# Altium footprint library PCB_IntegratedCircuit.PcbLib: 75 footprints (part 5 of 5)
Each footprint in its own frame and in the unit in brackets; x right, y up, seen from the top. Pads: shape width x height; smd on the part's side, far side on the other; paste and mask are expansions set on the pad; w line width, h text height; cw(c..) or ccw(c..) is an arc to the next point about the centre after c.
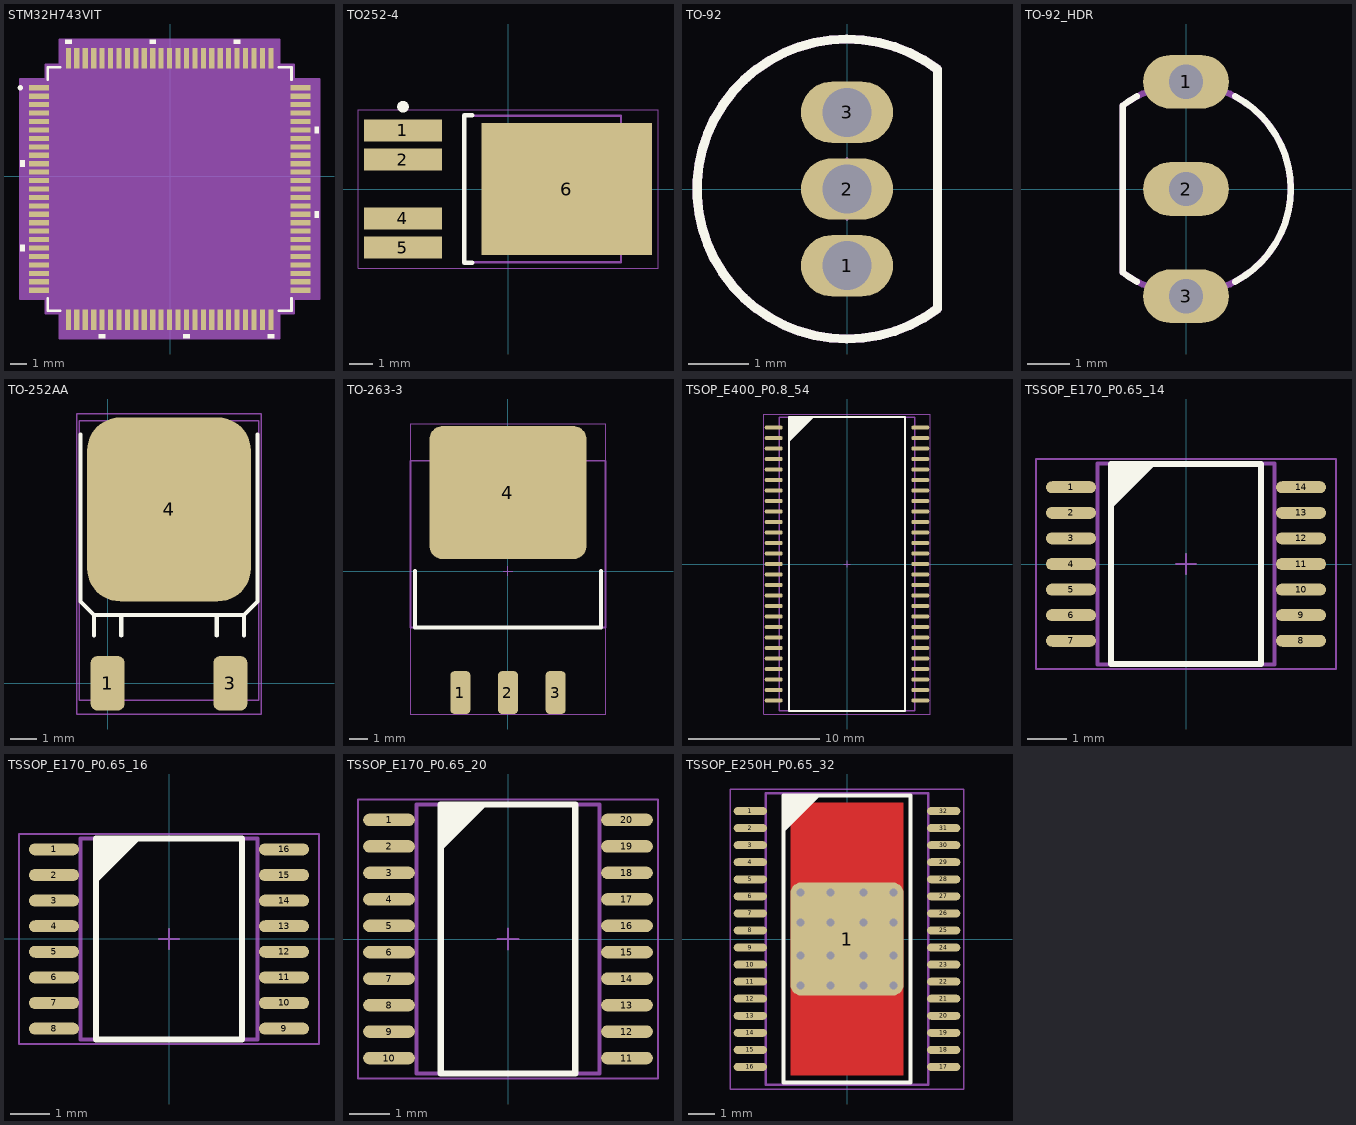
[diagram p4: the footprints below, top view; thin cyan lines are the x and y axes]

## STM32H743VIT [mil]
pads (100):
  rect 47x12 smd: 1(-306.12,206.22) 2(-306.12,186.54) 3(-306.12,166.85) 4(-306.12,147.17) 5(-306.12,127.48) 6(-306.12,107.8) 7(-306.12,88.11) 8(-306.12,68.43) 9(-306.12,48.74) 10(-306.12,29.06) 11(-306.12,9.37) 12(-306.12,-10.31) 13(-306.12,-30) 14(-306.12,-49.69) 15(-306.12,-69.37) 16(-306.12,-89.06) 17(-306.12,-108.74) 18(-306.12,-128.43) 19(-306.12,-148.11) 20(-306.12,-167.8) 21(-306.12,-187.48) 22(-306.12,-207.17) 23(-306.12,-226.85) 24(-306.12,-246.54) 25(-306.12,-266.22) 51(304.12,-266.22) 52(304.12,-246.54) 53(304.12,-226.85) 54(304.12,-207.17) 55(304.12,-187.48) 56(304.12,-167.8) 57(304.12,-148.11) 58(304.12,-128.43) 59(304.12,-108.74) 60(304.12,-89.06) 61(304.12,-69.37) 62(304.12,-49.69) 63(304.12,-30) 64(304.12,-10.31) 65(304.12,9.37) 66(304.12,29.06) 67(304.12,48.74) 68(304.12,68.43) 69(304.12,88.11) 70(304.12,107.8) 71(304.12,127.48) 72(304.12,147.17) 73(304.12,166.85) 74(304.12,186.54) 75(304.12,206.22)
  rect 12x47 smd: 26(-237.22,-335.12) 27(-217.54,-335.12) 28(-197.85,-335.12) 29(-178.17,-335.12) 30(-158.48,-335.12) 31(-138.8,-335.12) 32(-119.11,-335.12) 33(-99.43,-335.12) 34(-79.74,-335.12) 35(-60.06,-335.12) 36(-40.37,-335.12) 37(-20.68,-335.12) 38(-1,-335.12) 39(18.68,-335.12) 40(38.37,-335.12) 41(58.06,-335.12) 42(77.74,-335.12) 43(97.43,-335.12) 44(117.11,-335.12) 45(136.8,-335.12) 46(156.48,-335.12) 47(176.17,-335.12) 48(195.85,-335.12) 49(215.54,-335.12) 50(235.22,-335.12) 76(235.22,275.12) 77(215.54,275.12) 78(195.85,275.12) 79(176.17,275.12) 80(156.48,275.12) 81(136.8,275.12) 82(117.11,275.12) 83(97.43,275.12) 84(77.74,275.12) 85(58.06,275.12) 86(38.37,275.12) 87(18.68,275.12) 88(-1,275.12) 89(-20.68,275.12) 90(-40.37,275.12) 91(-60.06,275.12) 92(-79.74,275.12) 93(-99.43,275.12) 94(-119.11,275.12) 95(-138.8,275.12) 96(-158.48,275.12) 97(-178.17,275.12) 98(-197.85,275.12) 99(-217.54,275.12) 100(-237.22,275.12)
Top Overlay:
  circle w6: c-349.46,206.22 r3
  region: -229.72,308.62 -244.72,308.62 -244.72,318.62 -229.72,318.62
  region: -32.87,308.62 -47.87,308.62 -47.87,318.62 -32.87,318.62
  region: 163.98,308.62 148.98,308.62 148.98,318.62 163.98,318.62
  region: 337.62,115.3 347.62,115.3 347.62,100.3 337.62,100.3
  region: 337.62,-81.56 347.62,-81.56 347.62,-96.56 337.62,-96.56
  region: 242.72,-368.62 227.72,-368.62 227.72,-378.62 242.72,-378.62
  region: 45.87,-368.62 30.87,-368.62 30.87,-378.62 45.87,-378.62
  region: -150.98,-368.62 -165.98,-368.62 -165.98,-378.62 -150.98,-378.62
  region: -339.62,-160.3 -349.62,-160.3 -349.62,-175.3 -339.62,-175.3
  region: -339.62,36.56 -349.62,36.56 -349.62,21.56 -339.62,21.56
  lines w6: -285.5,-285.32 -285.5,-314.5 -256.32,-314.5 ; -285.5,225.32 -285.5,254.5 -256.32,254.5 ; 254.32,-314.5 283.5,-314.5 283.5,-285.32 ; 254.32,254.5 283.5,254.5 283.5,225.32
Mechanical 13:
  circle w0: c-257.62,206.22 r3
B-Component:
  region: -257.22,-319.5 -290.5,-319.5 -290.5,-286.22 -349.62,-286.22 -349.62,226.22 -290.5,226.22 -290.5,259.5 -257.22,259.5 -257.22,318.62 255.22,318.62 255.22,259.5 288.5,259.5 288.5,226.22 347.62,226.22 347.62,-286.22 288.5,-286.22 288.5,-319.5 255.22,-319.5 255.22,-378.62 -257.22,-378.62
  lines w6: -349.62,-286.22 -349.62,226.22 -290.5,226.22 -290.5,259.5 -257.22,259.5 -257.22,318.62 255.22,318.62 255.22,259.5 288.5,259.5 288.5,226.22 347.62,226.22 347.62,-286.22 288.5,-286.22 288.5,-319.5 255.22,-319.5 255.22,-378.62 -257.22,-378.62 -257.22,-319.5 -290.5,-319.5 -290.5,-286.22 -349.62,-286.22
Multi-Layer:
  text "Copyright (C) 2016 Accelerated Designs. All rights reserved" at -1,-30 h1
3D body "LQFP100-14x14mm.stp": height 63.1, standoff 0, extent -315.84,-344.84 313.84,284.84

## TO252-4 [mm]
height 2.38
pads (5):
  rect 3.4x0.95 smd: 1(-4.55,2.54) 2(-4.55,1.27) 4(-4.55,-1.27) 5(-4.55,-2.54)
  rect 7.4x5.7 smd: 6(2.55,0)
Top Overlay:
  circle w0.25: c-4.55,3.565 r0.125
  lines w0.2: -1.55,-3.2 -1.9,-3.2 -1.9,3.2 -1.55,3.2
Mechanical 13:
  lines w0.1: -1.9,-3.175 4.9,-3.175 4.9,3.175 -1.9,3.175 -1.9,-3.175
B-Component:
  lines w0.05: -6.5,-3.425 6.5,-3.425 6.5,3.425 -6.5,3.425 -6.5,-3.425
  lines w0.1: -0.5,0 0.5,0 ; 0,-0.5 0,0.5
3D body: height 2.38, standoff 0, extent -1.9,-3.175 4.9,3.175

## TO-92 [mil]
pads (3):
  oval 60x40 hole 32: 1(0,-50) 2(0,0) 3(0,50)
Top Overlay:
  lines w6: 59.06,-77.95 cw(c0,0) 59.06,77.95 59.05,-77.95
Mechanical 13:
  lines w2: -10,0 10,0 ; 0,-10 0,10
  lines w6: 59.06,-77.95 cw(c0,0) 59.06,77.95 59.05,-77.95
B-Component:
  lines w2: -20,0 20,0 ; 0,-20 0,20
3D body "SW3dPS-TO-92.STEP": height 405.76, standoff -228.35, extent -120,-124.1 69.37,120

## TO-92_HDR [mil]
pads (3):
  oval 80x50 hole 32: 1(0,100) 2(0,0) 3(0,-100)
Top Overlay:
  lines w6: -45.76,-86.43 cw(c0,0) -59.06,-77.95 -59.05,77.95 cw(c0,0) -45.76,86.43 ; 45.76,-86.43 ccw(c0,0) 45.76,86.43
Mechanical 13:
  lines w2: -10,0 10,0 ; 0,-10 0,10
  lines w6: -59.06,-77.95 ccw(c0,0) -59.06,77.95 -59.05,-77.95
B-Component:
  lines w2: -20,0 20,0 ; 0,-20 0,20
3D body "User Library-TO-92-4.STEP": height 409.84, standoff -300, extent -60.24,-112.28 104.72,113.7

## TO-252AA [mil]
pads (3):
  rrect40% 50x80 smd: 1(0,0) 3(180,0)
  rrect40% 240x270 smd: 4(90,255)
Top Overlay:
  lines w6: -40,365 -40,120 -20,100 ; -20,70 -20,100 ; 20,70 20,100 ; 160,70 160,100 ; 200,70 200,100 ; 220,365 220,120 200,100 ; -20,100 200,100
Mechanical 13:
  lines w2: -42,-25 222,-25 222,385 -42,385 -42,-25
T-Component:
  lines w2: -45,-45 -45,395 225,395 225,-45 -45,-45
3D body "TO-252.STEP": height 90.56, standoff -4.52, extent -38.73,-16.77 218.75,374.5

## TO-263-3 [mil]
height 182.68
pads (4):
  rrect40% 42x90 smd: 1(-100,-255) 2(0,-255) 3(100,-255)
  rrect20% 330x280 smd: 4(0,165)
Top Overlay:
  lines w8: -195,0 -195,-118.11 195,-118.11 195,0
Mechanical 13:
  lines w2: -10,0 10,0 ; 0,-10 0,10
  lines w4: -204.72,-118.11 204.72,-118.11 204.72,231.89 -204.72,231.89 -204.72,-118.11
T-Component:
  lines w2: -205,-300 205,-300 205,310 -205,310 -205,-300
3D body "SW3dPS-to-263.STEP": height 184.65, standoff 0, extent -199.99,-292.88 200.01,315

## TSOP_E400_P0.8_54 [mil]
height 47.24
pads (54):
  oval 54x12 smd: 1(-220,409.45) 2(-220,377.95) 3(-220,346.46) 4(-220,314.96) 5(-220,283.46) 6(-220,251.97) 7(-220,220.47) 8(-220,188.98) 9(-220,157.48) 10(-220,125.98) 11(-220,94.49) 12(-220,62.99) 13(-220,31.5) 14(-220,0) 15(-220,-31.5) 16(-220,-62.99) 17(-220,-94.49) 18(-220,-125.98) 19(-220,-157.48) 20(-220,-188.98) 21(-220,-220.47) 22(-220,-251.97) 23(-220,-283.47) 24(-220,-314.96) 25(-220,-346.46) 26(-220,-377.95) 27(-220,-409.45) 28(220,-409.45) 29(220,-377.95) 30(220,-346.46) 31(220,-314.96) 32(220,-283.47) 33(220,-251.97) 34(220,-220.47) 35(220,-188.98) 36(220,-157.48) 37(220,-125.98) 38(220,-94.49) 39(220,-62.99) 40(220,-31.5) 41(220,0) 42(220,31.5) 43(220,62.99) 44(220,94.49) 45(220,125.98) 46(220,157.48) 47(220,188.98) 48(220,220.47) 49(220,251.97) 50(220,283.46) 51(220,314.96) 52(220,346.46) 53(220,377.95) 54(220,409.45)
Top Overlay:
  region: -174.21,440.94 -99.06,440.94 -174.21,365.79
  lines w6: -174.21,-440.94 -174.21,440.94 174.21,440.94 174.21,-440.94 -174.21,-440.94
Mechanical 13:
  lines w2: -10,0 10,0 ; 0,-10 0,10
  lines w4: -202.76,-440.94 -202.76,440.94 202.76,440.94 202.76,-440.94 -202.76,-440.94
T-Component:
  lines w2: -250,-450 250,-450 250,450 -250,450 -250,-450
3D body "SW3dPS-TSOP2-54.STEP": height 51, standoff -15.9, extent -231.5,-437.8 231.5,437

## TSSOP_E170_P0.65_14 [mil]
height 47.24
pads (14):
  oval 50x12 smd: 1(-115,76.77) 2(-115,51.18) 3(-115,25.59) 4(-115,0) 5(-115,-25.59) 6(-115,-51.18) 7(-115,-76.77) 8(115,-76.77) 9(115,-51.18) 10(115,-25.59) 11(115,0) 12(115,25.59) 13(115,51.18) 14(115,76.77)
Top Overlay:
  region: -75,100.47 -30,100.47 -75,55.47
  lines w6: -75,-100 75,-100 75,100 -75,100 -75,-100
Mechanical 13:
  lines w2: -10,0 10,0 ; 0,-10 0,10
  lines w3.94: -88.58,-100.39 88.58,-100.39 88.58,100.39 -88.58,100.39 -88.58,-100.39
T-Component:
  lines w2: -150,-105 -150,105 150,105 150,-105 -150,-105
3D body "User Library-tssop14-2.STEP": height 47.24, standoff 0, extent -125.98,-100.39 125.99,100.4

## TSSOP_E170_P0.65_16 [mil]
height 47.24
pads (16):
  oval 50x12 smd: 1(-115,89.57) 2(-115,63.98) 3(-115,38.39) 4(-115,12.8) 5(-115,-12.8) 6(-115,-38.39) 7(-115,-63.98) 8(-115,-89.57) 9(115,-89.57) 10(115,-63.98) 11(115,-38.39) 12(115,-12.8) 13(115,12.8) 14(115,38.39) 15(115,63.98) 16(115,89.57)
Top Overlay:
  region: -72.83,100.87 -27.83,100.87 -72.83,55.87
  lines w6: -72.83,-100.39 72.83,-100.39 72.83,100.39 -72.83,100.39 -72.83,-100.39
Mechanical 13:
  lines w2: -10,0 10,0 ; 0,-10 0,10
  lines w3.94: -88.58,-100.39 88.58,-100.39 88.58,100.39 -88.58,100.39 -88.58,-100.39
T-Component:
  lines w2: -150,-105 150,-105 150,105 -150,105 -150,-105
3D body "User Library-tssop16-2.STEP": height 47.24, standoff 0, extent -125.98,-100.39 125.99,100.4

## TSSOP_E170_P0.65_20 [mil]
height 47.24
pads (20):
  oval 50x12 smd: 1(-115,115.16) 2(-115,89.57) 3(-115,63.98) 4(-115,38.39) 5(-115,12.8) 6(-115,-12.8) 7(-115,-38.39) 8(-115,-63.98) 9(-115,-89.57) 10(-115,-115.16) 11(115,-115.16) 12(115,-89.57) 13(115,-63.98) 14(115,-38.39) 15(115,-12.8) 16(115,12.8) 17(115,38.39) 18(115,63.98) 19(115,89.57) 20(115,115.16)
Top Overlay:
  region: -65,130 -20,130 -65,85
  lines w6: -65,-130 65,-130 65,130 -65,130 -65,-130
Mechanical 13:
  lines w2: -10,0 10,0 ; 0,-10 0,10
  lines w3.94: -88.58,-129.92 88.58,-129.92 88.58,129.92 -88.58,129.92 -88.58,-129.92
T-Component:
  lines w2: -145,-135 -145,135 145,135 145,-135 -145,-135
3D body "User Library-TSSOP-20 6_6x4_4.STEP": height 41.69, standoff -1.62, extent -125.98,-129.91 125.99,129.93

## TSSOP_E250H_P0.65_32 [mil]
height 47.24
pads (33):
  oval 50x12 smd: 1(-145,191.93) 2(-145,166.34) 3(-145,140.75) 4(-145,115.16) 5(-145,89.57) 6(-145,63.98) 7(-145,38.39) 8(-145,12.8) 9(-145,-12.8) 10(-145,-38.39) 11(-145,-63.98) 12(-145,-89.57) 13(-145,-115.16) 14(-145,-140.75) 15(-145,-166.34) 16(-145,-191.93) 17(145,-191.93) 18(145,-166.34) 19(145,-140.75) 20(145,-115.16) 21(145,-89.57) 22(145,-63.98) 23(145,-38.39) 24(145,-12.8) 25(145,12.8) 26(145,38.39) 27(145,63.98) 28(145,89.57) 29(145,115.16) 30(145,140.75) 31(145,166.34) 32(145,191.93)
  rrect20% 170x170 smd: 1(0,0)
via -70,-70 diameter 24 hole 12
via 70,-70 diameter 24 hole 12
via -25,-70 diameter 24 hole 12
via 25,-70 diameter 24 hole 12
via 25,-25 diameter 24 hole 12
via -25,-25 diameter 24 hole 12
via 70,-25 diameter 24 hole 12
via -70,-25 diameter 24 hole 12
via 70,25 diameter 24 hole 12
via -70,25 diameter 24 hole 12
via 25,25 diameter 24 hole 12
via -25,25 diameter 24 hole 12
via -25,70 diameter 24 hole 12
via 25,70 diameter 24 hole 12
via -70,70 diameter 24 hole 12
via 70,70 diameter 24 hole 12
Top Layer:
  rectangle: -85,-205 85,205
Top Overlay:
  region: -95,215 -40,215 -95,160
  lines w6: -95,-215 95,-215 95,215 -95,215 -95,-215
Mechanical 13:
  lines w2: -10,0 10,0 ; 0,-10 0,10
  lines w3.94: -122.05,-218.5 122.05,-218.5 122.05,218.5 -122.05,218.5 -122.05,-218.5
T-Component:
  lines w2: -175,-225 175,-225 175,225 -175,225 -175,-225
3D body "SW3dPS-SSOP30-P065.STEP": height 43.26, standoff -1.57, extent -157.48,-180.79 157.48,207